# Altium footprint library ERNI SMD.PcbLib: 26 footprints (part 1 of 2) (continued)
## ERNI_064318 [mm] "12 Contacts Pitch 1.27  SMC Vertical Female Connector Type B" (continued)
  drawing of 236 lines, arcs and shapes, not listed
  text "a6" at -3.925,2.35 h0.9
  text "b6" at -3.925,-3.575 h0.9
  text "b1" at 4.8,-3.275 h0.9
  text "a1" at 4.8,2.375 h0.9
Mechanical 15:
  lines w0.1: -6.285,-3.8 -5.085,-3.8 -5.085,-1.3 -6.285,-1.3 -6.285,-3.8 ; -6.285,1.3 -5.085,1.3 -5.085,3.8 -6.285,3.8 -6.285,1.3 ; -3.575,-3.3 -3.575,-2.2 -2.775,-2.2 -2.775,-3.3 -3.575,-3.3 ; -3.575,2.2 -3.575,3.3 -2.775,3.3 -2.775,2.2 -3.575,2.2 ; -2.305,-3.3 -2.305,-2.2 -1.505,-2.2 -1.505,-3.3 -2.305,-3.3 ; -2.305,2.2 -2.305,3.3 -1.505,3.3 -1.505,2.2 -2.305,2.2 ; -1.035,-3.3 -1.035,-2.2 -0.235,-2.2 -0.235,-3.3 -1.035,-3.3 ; -1.035,2.2 -1.035,3.3 -0.235,3.3 -0.235,2.2 -1.035,2.2 ; 0.235,-3.3 0.235,-2.2 1.035,-2.2 1.035,-3.3 0.235,-3.3 ; 0.235,2.2 0.235,3.3 1.035,3.3 1.035,2.2 0.235,2.2 ; 1.505,-3.3 1.505,-2.2 2.305,-2.2 2.305,-3.3 1.505,-3.3 ; 1.505,2.2 1.505,3.3 2.305,3.3 2.305,2.2 1.505,2.2 ; 2.775,-3.3 2.775,-2.2 3.575,-2.2 3.575,-3.3 2.775,-3.3 ; 2.775,2.2 3.575,2.2 3.575,3.3 2.775,3.3 2.775,2.2 ; 5.085,-3.8 6.285,-3.8 6.285,-1.3 5.085,-1.3 5.085,-3.8 ; 5.085,1.3 5.085,3.8 6.285,3.8 6.285,1.3 5.085,1.3
3D body "ERNI_064318.stp": height 6.25, standoff -0.75, extent -6.35,-3.6 6.35,3.6

## ERNI_064321 [mm] "12 Contacts Pitch 1.27  SMC Vertical Male Connector Type Q"
height 6.7
pads (18):
  rect 0.8x1.1 smd: A1(3.175,-2.75) A2(1.905,-2.75) A3(0.635,-2.75) A4(-0.635,-2.75) A5(-1.905,-2.75) A6(-3.175,-2.75) B1(3.175,2.75) B2(1.905,2.75) B3(0.635,2.75) B4(-0.635,2.75) B5(-1.905,2.75) B6(-3.175,2.75)
  rect 1.2x2.5 smd: Mec1(-5.685,2.55) Mec2(-5.685,-2.55) Mec3(5.685,2.55) Mec4(5.685,-2.55)
  round 1 hole 1.6 unplated mask+0.3: Mech5(-5.385,0) Mech6(5.385,0)
Top Overlay:
  circle w0.25: c3.175,3.766 r0.125
  lines w0.2: -4.785,0.8 -4.785,1.625 4.785,1.625 4.785,0.8 ; -4.685,-0.714 -4.685,-2.025 ; -4.396,-0.15 -4.285,-0.15 -4.285,-1.625 4.285,-1.625 ; -4.285,-1.625 -4.685,-2.025 ; -3.93,-2.025 -4.685,-2.025 ; 3.93,-2.025 4.685,-2.025 ; 4.396,-0.15 4.285,-0.15 4.285,-1.625 ; 4.685,-0.714 4.685,-2.025 ; 4.285,-1.625 4.685,-2.025 ; -3.385,-0.785 -3.385,-0.485 -2.965,-0.485 -2.965,-0.785 -3.385,-0.785 ; -3.385,0.485 -3.385,0.785 -2.965,0.785 -2.965,0.485 -3.385,0.485 ; -2.115,-0.785 -2.115,-0.485 -1.695,-0.485 -1.695,-0.785 -2.115,-0.785 ; -2.115,0.485 -2.115,0.785 -1.695,0.785 -1.695,0.485 -2.115,0.485 ; -0.845,-0.785 -0.845,-0.485 -0.425,-0.485 -0.425,-0.785 -0.845,-0.785 ; -0.845,0.485 -0.845,0.785 -0.425,0.785 -0.425,0.485 -0.845,0.485 ; 0.425,-0.785 0.425,-0.485 0.845,-0.485 0.845,-0.785 0.425,-0.785 ; 0.425,0.485 0.425,0.785 0.845,0.785 0.845,0.485 0.425,0.485 ; 1.695,-0.785 1.695,-0.485 2.115,-0.485 2.115,-0.785 1.695,-0.785 ; 1.695,0.485 1.695,0.785 2.115,0.785 2.115,0.485 1.695,0.485 ; 2.965,-0.785 2.965,-0.485 3.385,-0.485 3.385,-0.785 2.965,-0.785 ; 2.965,0.485 2.965,0.785 3.385,0.785 3.385,0.485 2.965,0.485
  text "b6" at -3.875,2.35 h0.9
  text "a6" at -3.875,-3.775 h0.9
  text "a1" at 4.775,-3.375 h0.9
  text "b1" at 4.8,2.375 h0.9
Mechanical 8:
  lines w0.1: -6.385,0 -5.385,0 ; -5.385,-1 -5.385,0 ; -5.385,1 -5.385,0 ; -4.385,0 -5.385,0 ; -3.575,-3.3 -3.175,-2.75 ; -3.575,-2.2 -3.175,-2.75 ; -3.575,2.2 -3.175,2.75 ; -3.575,3.3 -3.175,2.75 ; -2.775,-3.3 -3.175,-2.75 ; -2.775,-2.2 -3.175,-2.75 ; -2.775,2.2 -3.175,2.75 ; -2.775,3.3 -3.175,2.75 ; -2.305,-3.3 -1.905,-2.75 ; -2.305,-2.2 -1.905,-2.75 ; -2.305,2.2 -1.905,2.75 ; -2.305,3.3 -1.905,2.75 ; -1.505,-3.3 -1.905,-2.75 ; -1.505,-2.2 -1.905,-2.75 ; -1.505,2.2 -1.905,2.75 ; -1.505,3.3 -1.905,2.75 ; -1.035,-3.3 -0.635,-2.75 ; -1.035,-2.2 -0.635,-2.75 ; -1.035,2.2 -0.635,2.75 ; -1.035,3.3 -0.635,2.75 ; -1,0 0,0 ; -0.235,-3.3 -0.635,-2.75 ; -0.235,-2.2 -0.635,-2.75 ; -0.235,2.2 -0.635,2.75 ; -0.235,3.3 -0.635,2.75 ; 0,-1 0,0 ; 0,1 0,0 ; 0.235,-3.3 0.635,-2.75 ; 0.235,-2.2 0.635,-2.75 ; 0.235,2.2 0.635,2.75 ; 0.235,3.3 0.635,2.75 ; 1,0 0,0 ; 1.035,-3.3 0.635,-2.75 ; 1.035,-2.2 0.635,-2.75 ; 1.035,2.2 0.635,2.75 ; 1.035,3.3 0.635,2.75 ; 1.505,-3.3 1.905,-2.75 ; 1.505,-2.2 1.905,-2.75 ; 1.505,2.2 1.905,2.75 ; 1.505,3.3 1.905,2.75 ; 2.305,-3.3 1.905,-2.75 ; 2.305,-2.2 1.905,-2.75 ; 2.305,2.2 1.905,2.75 ; 2.305,3.3 1.905,2.75 ; 2.775,-3.3 3.175,-2.75 ; 2.775,-2.2 3.175,-2.75 ; 2.775,2.2 3.175,2.75 ; 2.775,3.3 3.175,2.75 ; 3.575,-3.3 3.175,-2.75 ; 3.575,-2.2 3.175,-2.75 ; 3.575,2.2 3.175,2.75 ; 3.575,3.3 3.175,2.75 ; 4.385,0 5.385,0 ; 5.385,-1 5.385,0 ; 5.385,1 5.385,0 ; 6.385,0 5.385,0
Mechanical 14:
  drawing of 180 lines, arcs and shapes, not listed
  text "b6" at -3.875,2.35 h0.9
  text "a6" at -3.875,-3.775 h0.9
  text "a1" at 4.775,-3.375 h0.9
  text "b1" at 4.8,2.375 h0.9
Mechanical 15:
  lines w0.1: -6.285,-3.8 -6.285,-1.3 -5.085,-1.3 -5.085,-3.8 -6.285,-3.8 ; -6.285,1.3 -6.285,3.8 -5.085,3.8 -5.085,1.3 -6.285,1.3 ; -3.575,-3.3 -2.775,-3.3 -2.775,-2.2 -3.575,-2.2 -3.575,-3.3 ; -3.575,2.2 -2.775,2.2 -2.775,3.3 -3.575,3.3 -3.575,2.2 ; -2.305,-3.3 -1.505,-3.3 -1.505,-2.2 -2.305,-2.2 -2.305,-3.3 ; -2.305,2.2 -1.505,2.2 -1.505,3.3 -2.305,3.3 -2.305,2.2 ; -1.035,-3.3 -0.235,-3.3 -0.235,-2.2 -1.035,-2.2 -1.035,-3.3 ; -1.035,2.2 -0.235,2.2 -0.235,3.3 -1.035,3.3 -1.035,2.2 ; 0.235,-3.3 1.035,-3.3 1.035,-2.2 0.235,-2.2 0.235,-3.3 ; 0.235,2.2 1.035,2.2 1.035,3.3 0.235,3.3 0.235,2.2 ; 1.505,-3.3 2.305,-3.3 2.305,-2.2 1.505,-2.2 1.505,-3.3 ; 1.505,2.2 2.305,2.2 2.305,3.3 1.505,3.3 1.505,2.2 ; 2.775,-3.3 3.575,-3.3 3.575,-2.2 2.775,-2.2 2.775,-3.3 ; 2.775,2.2 2.775,3.3 3.575,3.3 3.575,2.2 2.775,2.2 ; 5.085,-3.8 5.085,-1.3 6.285,-1.3 6.285,-3.8 5.085,-3.8 ; 5.085,1.3 6.285,1.3 6.285,3.8 5.085,3.8 5.085,1.3
3D body "ERNI_064321.stp": height 6.7, standoff -0.75, extent -6.35,-3.6 6.35,3.6

## ERNI_124044 [mm] "26 Contacts Pitch 1.27 SMC Straight Female Connector Type B"
height 9.05
pads (32):
  rect 0.8x1.1 smd: A1(7.62,2.75) A2(6.35,2.75) A3(5.08,2.75) A4(3.81,2.75) A5(2.54,2.75) A6(1.27,2.75) A7(0,2.75) A8(-1.27,2.75) A9(-2.54,2.75) A10(-3.81,2.75) A11(-5.08,2.75) A12(-6.35,2.75) A13(-7.62,2.75) B1(7.62,-2.75) B2(6.35,-2.75) B3(5.08,-2.75) B4(3.81,-2.75) B5(2.54,-2.75) B6(1.27,-2.75) B7(0,-2.75) B8(-1.27,-2.75) B9(-2.54,-2.75) B10(-3.81,-2.75) B11(-5.08,-2.75) B12(-6.35,-2.75) B13(-7.62,-2.75)
  rect 1.2x2.5 smd: Mec1(10.13,2.55) Mec2(10.13,-2.55) Mec3(-10.13,2.55) Mec4(-10.13,-2.55)
  round 1 hole 1.6 unplated mask+0.3: Mec5(9.83,0) Mec6(-9.83,0)
Top Overlay:
  circle w0.25: c7.62,3.85 r0.125
  lines w0.2: -9.18,-1.675 9.18,-1.675 ; -9.18,1.675 9.18,1.675 ; -9.13,-1.095 -9.13,-1.525 -8.83,-1.225 ; -8.83,-0.831 -8.83,-1.225 ; -8.63,0.5 -8.63,1.525 -8.33,1.225 ; -8.56,-0.275 -8.33,-0.275 ; -8.532,-0.073 -8.33,-0.275 ; 8.532,-0.073 8.33,-0.275 ; 8.559,-0.275 8.33,-0.275 ; 8.63,1.525 8.33,1.225 ; 8.78,0.766 8.78,1.525 ; 8.83,-0.831 8.83,-1.225 ; 9.13,-1.095 9.13,-1.525 8.83,-1.225 ; -8.83,-1.225 8.83,-1.225 ; -8.33,-0.275 -8.33,1.225 ; -8.33,1.225 8.33,1.225 ; 8.33,-0.275 8.33,1.225 ; -7.984,-0.962 -7.984,-0.308 -7.257,-0.308 -7.257,-0.962 -7.984,-0.962 ; -7.984,0.308 -7.984,0.962 -7.257,0.962 -7.257,0.308 -7.984,0.308 ; -6.714,-0.962 -6.714,-0.308 -5.987,-0.308 -5.987,-0.962 -6.714,-0.962 ; -6.714,0.308 -6.714,0.962 -5.987,0.962 -5.987,0.308 -6.714,0.308 ; -5.444,-0.962 -5.444,-0.308 -4.717,-0.308 -4.717,-0.962 -5.444,-0.962 ; -5.444,0.308 -5.444,0.962 -4.717,0.962 -4.717,0.308 -5.444,0.308 ; -4.174,-0.962 -4.174,-0.308 -3.447,-0.308 -3.447,-0.962 -4.174,-0.962 ; -4.174,0.308 -4.174,0.962 -3.447,0.962 -3.447,0.308 -4.174,0.308 ; -2.904,-0.962 -2.904,-0.308 -2.177,-0.308 -2.177,-0.962 -2.904,-0.962 ; -2.904,0.308 -2.904,0.962 -2.177,0.962 -2.177,0.308 -2.904,0.308 ; -1.634,-0.962 -1.634,-0.308 -0.907,-0.308 -0.907,-0.962 -1.634,-0.962 ; -1.634,0.308 -1.634,0.962 -0.907,0.962 -0.907,0.308 -1.634,0.308 ; -0.364,-0.962 -0.364,-0.308 0.363,-0.308 0.363,-0.962 -0.364,-0.962 ; -0.364,0.308 -0.364,0.962 0.363,0.962 0.363,0.308 -0.364,0.308 ; 0.906,-0.962 0.906,-0.308 1.633,-0.308 1.633,-0.962 0.906,-0.962 ; 0.906,0.308 0.906,0.962 1.633,0.962 1.633,0.308 0.906,0.308 ; 2.176,-0.962 2.176,-0.308 2.903,-0.308 2.903,-0.962 2.176,-0.962 ; 2.176,0.308 2.176,0.962 2.903,0.962 2.903,0.308 2.176,0.308 ; 3.446,-0.962 3.446,-0.308 4.173,-0.308 4.173,-0.962 3.446,-0.962 ; 3.446,0.308 3.446,0.962 4.173,0.962 4.173,0.308 3.446,0.308 ; 4.716,-0.962 4.716,-0.308 5.443,-0.308 5.443,-0.962 4.716,-0.962 ; 4.716,0.308 4.716,0.962 5.443,0.962 5.443,0.308 4.716,0.308 ; 5.986,-0.962 5.986,-0.308 6.713,-0.308 6.713,-0.962 5.986,-0.962 ; 5.986,0.308 5.986,0.962 6.713,0.962 6.713,0.308 5.986,0.308 ; 7.256,-0.962 7.256,-0.308 7.983,-0.308 7.983,-0.962 7.256,-0.962 ; 7.256,0.308 7.256,0.962 7.983,0.962 7.983,0.308 7.256,0.308
  text "b1" at 9.1,-3.2 h0.75
  text "a1" at 9.1,2.4 h0.75
  text "13" at -8.4,-3.3 h0.75
Mechanical 8:
  drawing of 166 lines, arcs and shapes, not listed
Mechanical 14:
  drawing of 846 lines, arcs and shapes, not listed
  text "b1" at 9.1,-3.2 h0.75
  text "a1" at 9.1,2.4 h0.75
Mechanical 15:
  lines w0.05: -11.045,-4.05 11.045,-4.05 11.045,4.05 -11.045,4.05 -11.045,-4.05
3D body "ERNI_124044.stp": height 9.05, standoff -0.75, extent -10.795,-3.5 10.795,3.5

## ERNI_124045 [mm] "50 Contacts Pitch 1.27  SMC Straight Female Connector Type B"
height 9.05
pads (56):
  rect 0.8x1.1 smd: A1(15.24,2.75) A2(13.97,2.75) A3(12.7,2.75) A4(11.43,2.75) A5(10.16,2.75) A6(8.89,2.75) A7(7.62,2.75) A8(6.35,2.75) A9(5.08,2.75) A10(3.81,2.75) A11(2.54,2.75) A12(1.27,2.75) A13(0,2.75) A14(-1.27,2.75) A15(-2.54,2.75) A16(-3.81,2.75) A17(-5.08,2.75) A18(-6.35,2.75) A19(-7.62,2.75) A20(-8.89,2.75) A21(-10.16,2.75) A22(-11.43,2.75) A23(-12.7,2.75) A24(-13.97,2.75) A25(-15.24,2.75) B1(15.24,-2.75) B2(13.97,-2.75) B3(12.7,-2.75) B4(11.43,-2.75) B5(10.16,-2.75) B6(8.89,-2.75) B7(7.62,-2.75) B8(6.35,-2.75) B9(5.08,-2.75) B10(3.81,-2.75) B11(2.54,-2.75) B12(1.27,-2.75) B13(0,-2.75) B14(-1.27,-2.75) B15(-2.54,-2.75) B16(-3.81,-2.75) B17(-5.08,-2.75) B18(-6.35,-2.75) B19(-7.62,-2.75) B20(-8.89,-2.75) B21(-10.16,-2.75) B22(-11.43,-2.75) B23(-12.7,-2.75) B24(-13.97,-2.75) B25(-15.24,-2.75)
  rect 1.2x2.5 smd: Mec1(17.75,-2.55) Mec2(17.75,2.55) Mec3(-17.75,-2.55) Mec4(-17.75,2.55)
  round 1 hole 1.6 unplated mask+0.3: Mec5(17.45,0) Mec6(-17.45,0)
Top Overlay:
  drawing of 444 lines, arcs and shapes, not listed
  text "b1" at 16.8,-3.3 h0.77
  text "a1" at 16.8,2.4 h0.77
  text "25" at -16,-3.4 h0.77
Mechanical 8:
  drawing of 260 lines, arcs and shapes, not listed
Mechanical 14:
  drawing of 1664 lines, arcs and shapes, not listed
  text "b1" at 16.865,-3.275 h0.9
  text "a1" at 16.865,2.375 h0.9
3D body "ERNI_124045.stp": height 9.05, standoff -0.75, extent -18.415,-3.5 18.415,3.5

## ERNI_154741 [mil] "SMC, 26 Contacts Pitch 1.27, Dual Row Right Angle Female Connectors: Type Q"
height 151.57
pads (32):
  rect 31.5x31.5 smd: A1(-300,-25) A2(-250,-25) A3(-200,-25) A4(-150,-25) A5(-100,-25) A6(-50,-25) A7(0,-25) A8(50,-25) A9(100,-25) A10(150,-25) A11(200,-25) A12(250,-25) A13(300,-25) B1(-300,25) B2(-250,25) B3(-200,25) B4(-150,25) B5(-100,25) B6(-50,25) B7(0,25) B8(50,25) B9(100,25) B10(150,25) B11(200,25) B12(250,25) B13(300,25)
  rect 47.24x106.3 smd: Mec1(-398.82,-7.28) Mec2(-398.82,-200.2) Mec3(398.82,-7.28) Mec4(398.82,-200.2)
  round 39.37 hole 62.99 unplated mask+11.81: Mec5(-387.01,-103.74) Mec6(387.01,-103.74)
Top Overlay:
  circle w9.84: c-300,65 r4.92
  lines w7.87: -363.39,-182.5 363.39,-182.5 ; -359.17,-182.5 -359.17,-375.46 ; 359.17,-182.5 359.17,-375.46 ; -359.17,-375.46 359.17,-375.46 ; -359.17,-375.46 -347.34,-387.2 347.34,-387.2 359.17,-375.46
  text "13" at 365.16,-25.59 h35.43
  text "b" at -328.54,8.27 h35.43
  text "a" at -328.54,-41.73 h35.43
Mechanical 8:
  drawing of 252 lines, arcs and shapes, not listed
Mechanical 14:
  lines w3.94: -420.2,-160.24 -420.2,-245.51 -378.88,-245.51 -378.88,-182.5 378.88,-182.5 378.88,-245.51 420.2,-245.51 420.2,-160.24 ; -420.2,-47.3 -420.2,37.97 -378.88,37.97 -378.88,-21.18 -394.57,-21.18 -394.57,-186.53 -378.88,-186.53 ; -394.57,-166.82 -408.87,-166.82 -424.66,-157.65 -424.66,-49.89 -409.02,-40.81 -394.57,-40.81 ; -378.88,-9.35 378.88,-9.35 ; -359.17,-182.5 -359.17,-375.46 ; -318.28,-9.35 -318.28,36.77 -289.99,36.77 -289.99,13.2 -312.45,13.2 -312.45,-9.35 ; -268.39,-9.35 -268.39,36.77 -240.02,36.77 -240.02,13.2 -262.48,13.2 -262.48,-9.35 ; -218.42,-9.35 -218.42,36.77 -190.13,36.77 -190.13,13.2 -212.5,13.2 -212.5,-9.35 ; -168.44,-9.35 -168.44,36.77 -140.15,36.77 -140.15,13.2 -162.53,13.2 -162.53,-9.35 ; -118.47,-9.35 -118.47,36.77 -90.18,36.77 -90.18,13.2 -112.55,13.2 -112.55,-9.35 ; -68.58,-9.35 -68.58,36.77 -40.2,36.77 -40.2,13.2 -62.66,13.2 -62.66,-9.35 ; -18.52,-9.35 -18.52,36.77 9.77,36.77 9.77,13.2 -12.6,13.2 -12.6,-9.35 ; 31.37,-9.35 31.37,36.77 59.75,36.77 59.75,13.2 37.29,13.2 37.29,-9.35 ; 81.35,-9.35 81.35,36.77 109.72,36.77 109.72,13.2 87.26,13.2 87.26,-9.35 ; 131.32,-9.35 131.32,36.77 159.61,36.77 159.61,13.2 137.24,13.2 137.24,-9.35 ; 181.3,-9.35 181.3,36.77 209.59,36.77 209.59,13.2 187.21,13.2 187.21,-9.35 ; 231.27,-9.35 231.27,36.77 259.56,36.77 259.56,13.2 237.1,13.2 237.1,-9.35 ; 281.25,-9.35 281.25,36.77 309.54,36.77 309.54,13.2 287.16,13.2 287.16,-9.35 ; 359.17,-182.5 359.17,-375.46 ; 378.88,-186.53 394.57,-186.53 394.57,-21.18 378.88,-21.18 ; 392.69,-21.18 378.88,-21.18 ; 394.57,-166.82 408.87,-166.82 424.66,-157.65 424.66,-49.89 409.02,-40.81 394.57,-40.81 ; 420.2,-47.3 420.2,37.97 378.88,37.97 378.88,-21.18 ; -359.17,-375.46 359.17,-375.46 ; -359.17,-375.46 -347.34,-387.2 347.34,-387.2 359.17,-375.46
  text "a1" at -319.37,-98.19 h35.43
  text "a13" at 246.06,-98.66 h39.37
  text "a" at -328.54,-41.73 h35.43
  text "b" at -328.54,8.27 h35.43
3D body "ERNI_154741.stp": height 151.57, standoff -29.53, extent -425,-387.2 425,38

## ERNI_154742 [mm] "50 Contacts Pitch 1.27  SMC Right Angle Female Connector Type Q"
height 3.85
pads (56):
  rect 0.8x0.8 smd: A1(-15.24,-0.635) A2(-13.97,-0.635) A3(-12.7,-0.635) A4(-11.43,-0.635) A5(-10.16,-0.635) A6(-8.89,-0.635) A7(-7.62,-0.635) A8(-6.35,-0.635) A9(-5.08,-0.635) A10(-3.81,-0.635) A11(-2.54,-0.635) A12(-1.27,-0.635) A13(0,-0.635) A14(1.27,-0.635) A15(2.54,-0.635) A16(3.81,-0.635) A17(5.08,-0.635) A18(6.35,-0.635) A19(7.62,-0.635) A20(8.89,-0.635) A21(10.16,-0.635) A22(11.43,-0.635) A23(12.7,-0.635) A24(13.97,-0.635) A25(15.24,-0.635) B1(-15.24,0.635) B2(-13.97,0.635) B3(-12.7,0.635) B4(-11.43,0.635) B5(-10.16,0.635) B6(-8.89,0.635) B7(-7.62,0.635) B8(-6.35,0.635) B9(-5.08,0.635) B10(-3.81,0.635) B11(-2.54,0.635) B12(-1.27,0.635) B13(0,0.635) B14(1.27,0.635) B15(2.54,0.635) B16(3.81,0.635) B17(5.08,0.635) B18(6.35,0.635) B19(7.62,0.635) B20(8.89,0.635) B21(10.16,0.635) B22(11.43,0.635) B23(12.7,0.635) B24(13.97,0.635) B25(15.24,0.635)
  rect 1.2x2.7 smd: Mec1(17.75,-5.085) Mec2(17.75,-0.185) Mec3(-17.75,-5.085) Mec4(-17.75,-0.185)
  round 1 hole 1.6 unplated mask+0.3: Mec5(17.45,-2.635) Mec6(-17.45,-2.635)
Top Overlay:
  circle w0.25: c-15.241,1.651 r0.125
  lines w0.2: -16.75,-9.535 16.75,-9.535 ; 16.75,-4.635 16.75,-9.535 ; 16.751,-4.635 -16.751,-4.635 -16.751,-9.535 -16.45,-9.835 16.45,-9.835 16.75,-9.535
  text "b" at -16,0.3 h0.77
  text "a" at -16,-1 h0.77
  text "25" at 16.8,-0.7 h0.77
Mechanical 8:
  drawing of 254 lines, arcs and shapes, not listed
Mechanical 14:
  drawing of 164 lines, arcs and shapes, not listed
  text "a" at -15.991,-1.035 h0.9
  text "b" at -15.991,0.235 h0.9
  text "a1" at -15.758,-2.469 h0.9
  text "a25" at 13.869,-2.506 h1
3D body "ERNI_154742.stp": height 3.86, standoff -0.74, extent -18.416,-9.835 18.416,0.965

## ERNI_154767 [mil] "12 Contacts, Pitch 1.27, SMC Right Angle Male Connector Type B"
height 167.32
pads (86):
  rect 31.5x31.5 smd: A1(975,-25) A2(925,-25) A3(875,-25) A4(825,-25) A5(775,-25) A6(725,-25) A7(675,-25) A8(625,-25) A9(575,-25) A10(525,-25) A11(475,-25) A12(425,-25) A13(375,-25) A14(325,-25) A15(275,-25) A16(225,-25) A17(175,-25) A18(125,-25) A19(75,-25) A20(25,-25) A21(-25,-25) A22(-75,-25) A23(-125,-25) A24(-175,-25) A25(-225,-25) A26(-275,-25) A27(-325,-25) A28(-375,-25) A29(-425,-25) A30(-475,-25) A31(-525,-25) A32(-575,-25) A33(-625,-25) A34(-675,-25) A35(-725,-25) A36(-775,-25) A37(-825,-25) A38(-875,-25) A39(-925,-25) A40(-975,-25) B1(975,25) B2(925,25) B3(875,25) B4(825,25) B5(775,25) B6(725,25) B7(675,25) B8(625,25) B9(575,25) B10(525,25) B11(475,25) B12(425,25) B13(375,25) B14(325,25) B15(275,25) B16(225,25) B17(175,25) B18(125,25) B19(75,25) B20(25,25) B21(-25,25) B22(-75,25) B23(-125,25) B24(-175,25) B25(-225,25) B26(-275,25) B27(-325,25) B28(-375,25) B29(-425,25) B30(-475,25) B31(-525,25) B32(-575,25) B33(-625,25) B34(-675,25) B35(-725,25) B36(-775,25) B37(-825,25) B38(-875,25) B39(-925,25) B40(-975,25)
  rect 47.24x106.3 smd: Mec1(-1073.82,-7.28) Mec2(-1073.82,-200.2) Mec3(1073.82,-7.28) Mec4(1073.82,-200.2)
  round 39.37 hole 62.99 unplated mask+11.81: Mec5(-1062.01,-103.74) Mec6(1062.01,-103.74)
Top Overlay:
  circle w9.84: c975,65 r4.92
  lines w7.87: -1054.13,-265.16 -1054.13,-355.71 1054.13,-355.71 1054.13,-265.16 ; -1038.39,-9.25 -1002.56,-9.25 ; 1002.56,-9.25 1038.39,-9.25
  text "a40" at -952.76,-157.48 h39.37
  text "a1" at 997.24,-106.3 h39.37
Mechanical 8:
  drawing of 526 lines, arcs and shapes, not listed
Mechanical 14:
  drawing of 234 lines, arcs and shapes, not listed
  text "a40" at -952.76,-157.48 h39.37
  text "b" at 1041.14,19.68 h39.37
  text "a" at 1038.98,-47.24 h39.37
  text "a1" at 997.24,-106.3 h39.37
Mechanical 15:
  lines w3.94: -1109.84,-365.55 1109.84,-365.55 1109.84,55.71 -1109.84,55.71 -1109.84,-365.55
3D body "ERNI_154767.stp": height 167.32, standoff -29.53, extent -1099.99,-355.7 1100.01,38

## ERNI_154806 [mm] "26 Contacts Pitch 1.27  SMC Straight Female Connector Type B"
height 6.25
pads (32):
  rect 0.8x1.1 smd: A1(7.62,2.75) A2(6.35,2.75) A3(5.08,2.75) A4(3.81,2.75) A5(2.54,2.75) A6(1.27,2.75) A7(0,2.75) A8(-1.27,2.75) A9(-2.54,2.75) A10(-3.81,2.75) A11(-5.08,2.75) A12(-6.35,2.75) A13(-7.62,2.75) B1(7.62,-2.75) B2(6.35,-2.75) B3(5.08,-2.75) B4(3.81,-2.75) B5(2.54,-2.75) B6(1.27,-2.75) B7(0,-2.75) B8(-1.27,-2.75) B9(-2.54,-2.75) B10(-3.81,-2.75) B11(-5.08,-2.75) B12(-6.35,-2.75) B13(-7.62,-2.75)
  rect 1.2x2.5 smd: Mec1(10.13,-2.55) Mec2(10.13,2.55) Mec3(-10.13,-2.55) Mec4(-10.13,2.55)
  round 1 hole 1.6 unplated mask+0.3: Mec5(9.83,0) Mec6(-9.83,0)
Top Overlay:
  drawing of 256 lines, arcs and shapes, not listed
  text "13" at -8.3,-3.4 h0.9
  text "a1" at 9.245,2.375 h0.9
  text "b1" at 9.245,-3.275 h0.9
Mechanical 8:
  drawing of 164 lines, arcs and shapes, not listed
Mechanical 14:
  drawing of 968 lines, arcs and shapes, not listed
  text "a1" at 9.245,2.375 h0.9
  text "b1" at 9.245,-3.275 h0.9
3D body "ERNI_154806.stp": height 6.25, standoff -0.75, extent -10.795,-3.5 10.795,3.5

## ERNI_154807 [mm] "50 Contacts Pitch 1.27  SMC Straight Female Connector Type B"
height 6.25
pads (56):
  rect 0.8x1.1 smd: A1(15.24,2.75) A2(13.97,2.75) A3(12.7,2.75) A4(11.43,2.75) A5(10.16,2.75) A6(8.89,2.75) A7(7.62,2.75) A8(6.35,2.75) A9(5.08,2.75) A10(3.81,2.75) A11(2.54,2.75) A12(1.27,2.75) A13(0,2.75) A14(-1.27,2.75) A15(-2.54,2.75) A16(-3.81,2.75) A17(-5.08,2.75) A18(-6.35,2.75) A19(-7.62,2.75) A20(-8.89,2.75) A21(-10.16,2.75) A22(-11.43,2.75) A23(-12.7,2.75) A24(-13.97,2.75) A25(-15.24,2.75) B1(15.24,-2.75) B2(13.97,-2.75) B3(12.7,-2.75) B4(11.43,-2.75) B5(10.16,-2.75) B6(8.89,-2.75) B7(7.62,-2.75) B8(6.35,-2.75) B9(5.08,-2.75) B10(3.81,-2.75) B11(2.54,-2.75) B12(1.27,-2.75) B13(0,-2.75) B14(-1.27,-2.75) B15(-2.54,-2.75) B16(-3.81,-2.75) B17(-5.08,-2.75) B18(-6.35,-2.75) B19(-7.62,-2.75) B20(-8.89,-2.75) B21(-10.16,-2.75) B22(-11.43,-2.75) B23(-12.7,-2.75) B24(-13.97,-2.75) B25(-15.24,-2.75)
  rect 1.2x2.5 smd: Mec1(17.75,-2.55) Mec2(17.75,2.55) Mec3(-17.75,-2.55) Mec4(-17.75,2.55)
  round 1 hole 1.6 unplated mask+0.3: Mec5(17.45,0) Mec6(-17.45,0)
Top Overlay:
  drawing of 448 lines, arcs and shapes, not listed
  text "b1" at 16.865,-3.275 h0.9
  text "a1" at 16.865,2.375 h0.9
  text "25" at -15.9,-3.4 h0.9
Mechanical 8:
  drawing of 260 lines, arcs and shapes, not listed
Mechanical 14:
  drawing of 1664 lines, arcs and shapes, not listed
  text "b1" at 16.865,-3.275 h0.9
  text "a1" at 16.865,2.375 h0.9
3D body "ERNI_154807.stp": height 6.25, standoff -0.75, extent -18.415,-3.5 18.415,3.5

## ERNI_154819 [mm] "26 Contacts Pitch 1.27  SMC Straight Male Connector Type Q"
height 6.7
pads (32):
  rect 0.8x1.1 smd: A1(7.623,-2.75) A2(6.353,-2.75) A3(5.083,-2.75) A4(3.813,-2.75) A5(2.543,-2.75) A6(1.273,-2.75) A7(0.003,-2.75) A8(-1.267,-2.75) A9(-2.537,-2.75) A10(-3.807,-2.75) A11(-5.077,-2.75) A12(-6.347,-2.75) A13(-7.617,-2.75) B1(7.623,2.75) B2(6.353,2.75) B3(5.083,2.75) B4(3.812,2.75) B5(2.542,2.75) B6(1.272,2.75) B7(0.002,2.75) B8(-1.268,2.75) B9(-2.538,2.75) B10(-3.808,2.75) B11(-5.078,2.75) B12(-6.348,2.75) B13(-7.618,2.75)
  rect 1.2x2.5 smd: Mec1(10.133,-2.55) Mec2(10.123,2.55) Mec3(-10.118,-2.55) Mec4(-10.138,2.55)
  round 1 hole 1.6 unplated mask+0.3: Mec5(9.833,0) Mec6(-9.828,0)
Top Overlay:
  circle w0.25: c7.622,-3.766 r0.125
  lines w0.2: -9.23,0.922 -9.23,1.625 ; -9.23,2.1 -8.3,2.1 ; -9.23,2.5 -8.58,2.5 -8.58,2.1 ; -9.13,-0.849 -9.13,-2.025 ; -8.73,-0.15 -8.73,-1.625 ; -8.375,-2.025 -9.13,-2.025 ; -7.5,-1.625 -7.5,-1.75 -6.5,-1.75 -6.5,-1.627 ; -7.5,1.625 -7.5,1.75 -6.5,1.75 -6.5,1.625 ; 6.5,-1.625 6.5,-1.75 7.5,-1.75 7.5,-1.625 ; 6.5,1.625 6.5,1.75 7.5,1.75 7.5,1.625 ; 8.375,-2.025 9.13,-2.025 ; 8.73,-0.15 8.73,-1.625 ; 9.13,-0.849 9.13,-2.025 ; 9.23,0.922 9.23,1.625 -9.23,1.625 ; -9.23,1.625 -9.23,1.625 ; -9.13,-2.025 -8.73,-1.625 ; -8.73,-1.625 8.73,-1.625 ; 8.73,-1.625 9.13,-2.025 ; 9.13,-2.025 9.13,-2.025 ; -7.83,-0.785 -7.83,-0.485 -7.41,-0.485 -7.41,-0.785 -7.83,-0.785 ; -7.83,0.485 -7.83,0.785 -7.41,0.785 -7.41,0.485 -7.83,0.485 ; -6.56,-0.785 -6.56,-0.485 -6.14,-0.485 -6.14,-0.785 -6.56,-0.785 ; -6.56,0.485 -6.14,0.485 -6.14,0.785 -6.56,0.785 -6.56,0.485 ; -5.29,-0.785 -5.29,-0.485 -4.87,-0.485 -4.87,-0.785 -5.29,-0.785 ; -5.29,0.485 -4.87,0.485 -4.87,0.785 -5.29,0.785 -5.29,0.485 ; -4.02,-0.785 -4.02,-0.485 -3.6,-0.485 -3.6,-0.785 -4.02,-0.785 ; -4.02,0.485 -3.6,0.485 -3.6,0.785 -4.02,0.785 -4.02,0.485 ; -2.75,-0.785 -2.75,-0.485 -2.33,-0.485 -2.33,-0.785 -2.75,-0.785 ; -2.75,0.485 -2.33,0.485 -2.33,0.785 -2.75,0.785 -2.75,0.485 ; -1.48,-0.785 -1.48,-0.485 -1.06,-0.485 -1.06,-0.785 -1.48,-0.785 ; -1.48,0.485 -1.06,0.485 -1.06,0.785 -1.48,0.785 -1.48,0.485 ; -0.21,-0.785 -0.21,-0.485 0.21,-0.485 0.21,-0.785 -0.21,-0.785 ; -0.21,0.485 0.21,0.485 0.21,0.785 -0.21,0.785 -0.21,0.485 ; 1.06,-0.785 1.06,-0.485 1.48,-0.485 1.48,-0.785 1.06,-0.785 ; 1.06,0.485 1.48,0.485 1.48,0.785 1.06,0.785 1.06,0.485 ; 2.33,-0.785 2.33,-0.485 2.75,-0.485 2.75,-0.785 2.33,-0.785 ; 2.33,0.485 2.75,0.485 2.75,0.785 2.33,0.785 2.33,0.485 ; 3.6,-0.785 3.6,-0.485 4.02,-0.485 4.02,-0.785 3.6,-0.785 ; 3.6,0.485 4.02,0.485 4.02,0.785 3.6,0.785 3.6,0.485 ; 4.87,-0.785 4.87,-0.485 5.29,-0.485 5.29,-0.785 4.87,-0.785 ; 4.87,0.485 5.29,0.485 5.29,0.785 4.87,0.785 4.87,0.485 ; 6.14,-0.785 6.14,-0.485 6.56,-0.485 6.56,-0.785 6.14,-0.785 ; 6.14,0.485 6.56,0.485 6.56,0.785 6.14,0.785 6.14,0.485 ; 7.41,-0.785 7.41,-0.485 7.83,-0.485 7.83,-0.785 7.41,-0.785 ; 7.41,0.485 7.41,0.785 7.83,0.785 7.83,0.485 7.41,0.485
  text "a1" at 9.232,-3.425 h0.9
  text "b1" at 9.232,2.35 h0.9
  text "13" at -8.303,-3.775 h0.9
Mechanical 8:
  drawing of 167 lines, arcs and shapes, not listed
Mechanical 14:
  drawing of 195 lines, arcs and shapes, not listed
  text "13" at -8.303,-3.775 h0.9
  text "a1" at 9.232,-3.425 h0.9
  text "b1" at 9.232,2.35 h0.9
3D body "ERNI_154819.stp": height 6.75, standoff -0.75, extent -10.795,-3.6 10.78,3.6